# Altium footprint library motionboard.PcbLib: 89 footprints (part 4 of 6)
Each footprint in its own frame and in the unit in brackets; x right, y up, seen from the top. Pads: shape width x height; smd on the part's side, far side on the other; paste and mask are expansions set on the pad; w line width, h text height; cw(c..) or ccw(c..) is an arc to the next point about the centre after c.
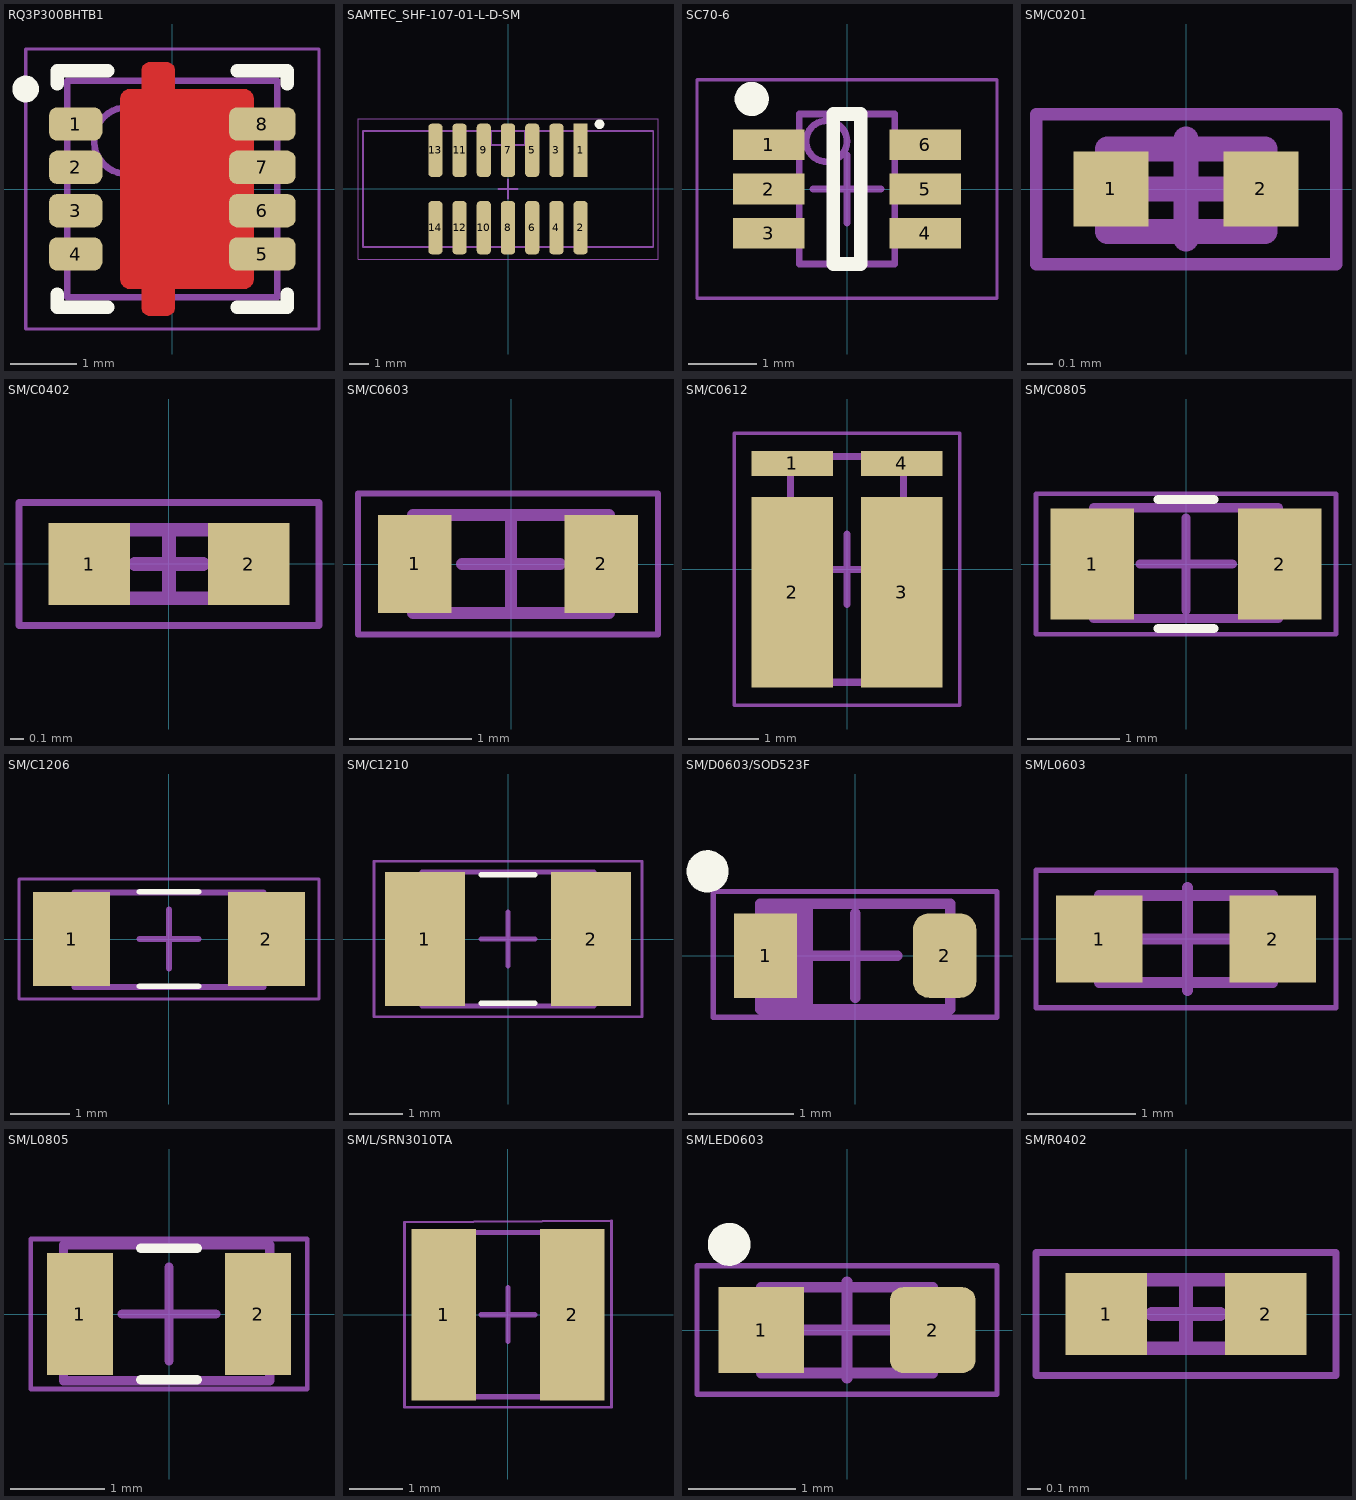
[diagram p3: the footprints below, top view; thin cyan lines are the x and y axes]

## RQ3P300BHTB1 [mm] "8-Leads, Body 3.15x3.05mm, Pitch 0.65mm, Thermal Pad 3.00x2.00mm, Manufacturer Guidelines"
height 0.85
pads (8):
  rrect50% 0.8x0.5 smd: 1(-1.45,0.975) 2(-1.45,0.325) 3(-1.45,-0.325) 4(-1.45,-0.975)
  rrect50% 1x0.5 smd: 5(1.35,-0.975) 6(1.35,-0.325) 7(1.35,0.325) 8(1.35,0.975)
Top Layer:
  region: -0.78,-1.35 -0.78,-1.365 -0.774,-1.394 -0.763,-1.421 -0.747,-1.446 -0.726,-1.467 -0.701,-1.483 -0.674,-1.494 -0.645,-1.5 -0.63,-1.5 -0.46,-1.5 -0.46,-1.775 -0.46,-1.8 -0.441,-1.846 -0.406,-1.881 -0.36,-1.9 -0.335,-1.9 -0.085,-1.9 -0.06,-1.9 -0.014,-1.881 0.021,-1.846 0.04,-1.8 0.04,-1.775 0.04,-1.5 1.07,-1.5 1.085,-1.5 1.114,-1.494 1.141,-1.483 1.166,-1.467 1.187,-1.446 1.203,-1.421 1.214,-1.394 1.22,-1.365 1.22,-1.35 1.22,1.35 1.22,1.365 1.214,1.394 1.203,1.421 1.187,1.446 1.166,1.467 1.141,1.483 1.114,1.494 1.085,1.5 1.07,1.5 0.04,1.5 0.04,1.775 0.04,1.8 0.021,1.846 -0.014,1.881 -0.06,1.9 -0.085,1.9 -0.335,1.9 -0.36,1.9 -0.406,1.881 -0.441,1.846 -0.46,1.8 -0.46,1.775 -0.46,1.5 -0.63,1.5 -0.645,1.5 -0.674,1.494 -0.701,1.483 -0.726,1.467 -0.747,1.446 -0.763,1.421 -0.774,1.394 -0.78,1.365 -0.78,1.35
Top Overlay:
  circle w0.2: c-2.2,1.5 r0.1
  lines w0.2: -1.725,-1.575 -1.725,-1.775 -0.97,-1.775 ; -1.725,1.575 -1.725,1.775 -0.97,1.775 ; 0.97,-1.775 1.725,-1.775 1.725,-1.575 ; 0.97,1.775 1.725,1.775 1.725,1.575
Top Assembly:
  circle w0.1: c-0.675,0.725 r0.5
  lines w0.1: -1.575,-1.625 1.575,-1.625 1.575,1.625 -1.575,1.625 -1.575,-1.625
Top Courtyard:
  lines w0.05: -2.2,-2.1 2.2,-2.1 2.2,2.1 -2.2,2.1 -2.2,-2.1
  lines w0.1: -0.5,0 0.5,0 ; 0,-0.5 0,0.5
Top Designator:
  text ".Designator" at -2.792,-0.272 h1.2
3D body "RQ3P300BHTB1.STEP": height 0.95, standoff 0, extent -1.699,-1.709 1.701,1.711

## SAMTEC_SHF-107-01-L-D-SM [mm]
pads (14):
  rect 0.74x2.795 smd: 1(3.81,2.032)
  rrect50% 0.74x2.795 smd: 2(3.81,-2.032) 3(2.54,2.032) 4(2.54,-2.032) 5(1.27,2.032) 6(1.27,-2.032) 7(0,2.032) 8(0,-2.032) 9(-1.27,2.032) 10(-1.27,-2.032) 11(-2.54,2.032) 12(-2.54,-2.032) 13(-3.81,2.032) 14(-3.81,-2.032)
Top Overlay:
  circle w0.3: c4.8,3.4 r0.1
Top Assembly:
  lines w0.1: -0.9,3.05 -0.9,2.302 0.9,2.302 0.9,3.05 ; -7.604,-3.048 7.62,-3.048 7.62,3.05 -7.604,3.05 -7.604,-3.048
Top Courtyard:
  lines w0.05: -7.87,-3.68 7.87,-3.68 7.87,3.68 -7.87,3.68 -7.87,-3.68
  lines w0.1: -0.5,0 0.5,0 ; 0,-0.5 0,0.5
Top Designator:
  text ".Designator" at -2.705,-0.272 h1.2
3D body "SHF-107-01-L-D-SM.stp": height 5.33, standoff -0.13, extent -7.62,-3.048 7.62,3.048

## SC70-6 [mm] "SOT363, 6-Leads, Body 2x1.3mm, Pitch 0.65mm, Lead Span 2.1mm, IPC Low Density"
height 1.1
pads (6):
  rect 1.05x0.45 smd: 1(-1.15,0.65) 2(-1.15,0) 3(-1.15,-0.65) 4(1.15,-0.65) 5(1.15,0) 6(1.15,0.65)
Top Overlay:
  circle w0.3: c-1.397,1.321 r0.1
  lines w0.2: -0.2,-1.1 0.2,-1.1 0.2,1.1 -0.2,1.1 -0.2,-1.1
Top Assembly:
  circle w0.1: c-0.3,0.7 r0.3
  lines w0.1: -0.7,-1.1 -0.7,1.1 0.7,1.1 0.7,-1.1 -0.7,-1.1
Top Courtyard:
  lines w0.05: -2.2,-1.6 -2.2,1.6 2.2,1.6 2.2,-1.6 -2.2,-1.6
  lines w0.1: -0.5,0 0,0 ; 0,-0.5 0,0 ; 0,0.5 0,0 ; 0.5,0 0,0
Top Designator:
  text ".Designator" at -2.705,-0.272 h1.2
3D body "SC-70-6.STEP": height 1.1, standoff -0.01, extent -1.15,-1.132 1.1,1.118

## SM/C0201 [mm]
pads (2):
  rect 0.3x0.3 smd: 1(-0.3,0) 2(0.3,0)
Top Assembly:
  lines w0.1: -0.314,-0.171 -0.314,0.159 0.316,0.159 0.316,-0.171 -0.314,-0.171
Top Courtyard:
  lines w0.05: -0.6,-0.3 -0.6,0.3 0.6,0.3 0.6,-0.3 -0.6,-0.3
  lines w0.1: -0.2,0 0,0 ; 0,-0.2 0,0 ; 0,0.2 0,0 ; 0.2,0 0,0
Top Designator:
  text ".Designator" at -2.705,-0.272 h1.2
3D body "c0201c104k9pactu.stp": height 0.33, standoff 0, extent -0.314,-0.171 0.316,0.159

## SM/C0402 [mm] "Chip Resistor, 2-Leads, Body 1.00x0.50mm, IPC Medium Density"
height 0.6
pads (2):
  rect 0.6x0.6 smd: 1(-0.584,0) 2(0.584,0)
Top Assembly:
  lines w0.1: -0.5,-0.25 -0.5,0.25 0.5,0.25 0.5,-0.25 -0.5,-0.25
Top Courtyard:
  lines w0.05: -1.1,-0.45 1.1,-0.45 1.1,0.45 -1.1,0.45 -1.1,-0.45
  lines w0.1: -0.25,0 0.25,0 ; 0,-0.25 0,0.25
Top Designator:
  text ".Designator" at -2.705,-0.272 h1.2
3D body "C0402.STEP": height 0.5, standoff 0, extent -0.5,-0.25 0.5,0.25

## SM/C0603 [mm] "Chip Capacitor, Body 1.6x0.8mm, IPC Low Density"
height 0.6
pads (2):
  rect 0.6x0.8 smd: 1(-0.787,0) 2(0.737,0)
Top Assembly:
  lines w0.1: -0.8,-0.4 0.8,-0.4 0.8,0.4 -0.8,0.4 -0.8,-0.4
Top Courtyard:
  lines w0.05: -1.25,-0.575 1.2,-0.575 1.2,0.575 -1.25,0.575 -1.25,-0.575
  lines w0.1: -0.4,0 0.4,0 ; 0,-0.4 0,0.4
Top Designator:
  text ".Designator" at -2.73,-0.272 h1.2
3D body "SM-C603.STEP": height 0.6, standoff 0, extent -0.8,-0.4 0.8,0.4

## SM/C0612 [mm] "Chip Resistor, Body 1.6x3.2mm, IPC Low Density"
height 0.71
pads (4):
  rect 1.15x0.35 smd: 1(-0.775,1.5) 4(0.775,1.5)
  rect 1.15x2.7 smd: 2(-0.775,-0.325) 3(0.775,-0.325)
Top Assembly:
  lines w0.1: -0.8,-1.6 0.8,-1.6 0.8,1.6 -0.8,1.6 -0.8,-1.6
Top Courtyard:
  lines w0.05: -1.6,-1.925 -1.6,1.925 1.6,1.925 1.6,-1.925 -1.6,-1.925
  lines w0.1: -0.5,0 0.5,0 ; 0,-0.5 0,0.5
Top Designator:
  text ".Designator" at -2.705,-0.272 h1.2
3D body "KRL3216T4A-M-R005-F-T1.STEP": height 0.7, standoff 0, extent -0.8,-1.6 0.8,1.6

## SM/C0805 [mm] "Chip Resistor, Body 2.0x1.3mm, IPC Low Density"
height 0.65
pads (2):
  rect 0.9x1.2 smd: 1(-1.016,0) 2(1.016,0)
Top Overlay:
  lines w0.1: -0.3,-0.7 0.3,-0.7 ; -0.3,0.7 0.3,0.7
Top Assembly:
  lines w0.1: -1,-0.59 -1,0.61 1,0.61 1,-0.59 -1,-0.59
Top Courtyard:
  lines w0.05: -1.626,-0.762 1.626,-0.762 1.626,0.762 -1.626,0.762 -1.626,-0.762
  lines w0.1: -0.5,0 0.5,0 ; 0,-0.5 0,0.5
Top Designator:
  text ".Designator" at -2.705,-0.272 h1.2
3D body "User Library-cap_0805-1.STEP": height 1.2, standoff 0, extent -1,-0.59 1,0.61

## SM/C1206 [mm] "Chip Resistor, Body 3.2x1.6mm, IPC Low Density"
height 0.71
pads (2):
  rect 1.3x1.6 smd: 1(-1.651,0) 2(1.651,0)
Top Overlay:
  lines w0.1: -0.5,-0.8 0.5,-0.8 ; -0.5,0.8 0.5,0.8
Top Assembly:
  lines w0.1: -1.6,-0.813 1.6,-0.813 1.6,0.787 -1.6,0.787 -1.6,-0.813
Top Courtyard:
  lines w0.05: -2.54,-1.016 -2.54,1.016 2.54,1.016 2.54,-1.016 -2.54,-1.016
  lines w0.1: -0.5,0 0.5,0 ; 0,-0.5 0,0.5
Top Designator:
  text ".Designator" at -2.705,-0.272 h1.2
3D body "CAP 1206.STEP": height 1.58, standoff -0.02, extent -1.6,-0.813 1.6,0.787

## SM/C1210 [mm] "Chip Resistor, Body 3.2x1.6mm, IPC Low Density"
height 0.71
pads (2):
  rect 1.5x2.5 smd: 1(-1.55,0) 2(1.55,0)
Top Overlay:
  lines w0.1: -0.5,-1.2 0.5,-1.2 ; -0.5,1.2 0.5,1.2
Top Assembly:
  lines w0.1: -1.6,-1.25 1.6,-1.25 1.6,1.25 -1.6,1.25 -1.6,-1.25
Top Courtyard:
  lines w0.05: -2.5,-1.45 2.5,-1.45 2.5,1.45 -2.5,1.45 -2.5,-1.45
  lines w0.1: -0.5,0 0.5,0 ; 0,-0.5 0,0.5
Top Designator:
  text ".Designator" at -2.705,-0.272 h1.2
3D body "1210.STEP": height 2.5, standoff 0, extent -1.6,-1.25 1.6,1.25

## SM/D0603/SOD523F [mm] "Chip Diode, 2-Leads, Body 1.70x0.80mm, IPC Medium Density"
height 0.6
pads (2):
  rect 0.6x0.8 smd: 1(-0.85,0)
  rrect50% 0.6x0.8 smd: 2(0.85,0)
Top Overlay:
  circle w0.2: c-1.4,0.8 r0.1
Top Assembly:
  rectangle: -0.901,-0.5 -0.4,0.492
  lines w0.1: -0.901,-0.508 0.901,-0.508 0.901,0.492 -0.901,0.492 -0.901,-0.508
Top Courtyard:
  lines w0.05: -1.346,-0.584 1.346,-0.584 1.346,0.61 -1.346,0.61 -1.346,-0.584
  lines w0.1: -0.4,0 0.4,0 ; 0,-0.4 0,0.4
Top Designator:
  text ".Designator" at -2.819,-0.076 h1.2
3D body "0603-SOD-523F.STEP": height 0.85, standoff -0.01, extent -0.901,-0.508 0.901,0.492

## SM/L0603 [mm] "Chip Capacitor, Body 1.6x0.8mm, IPC Low Density"
height 0.6
pads (2):
  rect 0.8x0.8 smd: 1(-0.8,0) 2(0.8,0)
Top Assembly:
  lines w0.1: -0.8,-0.4 -0.8,0.4 0.8,0.4 0.8,-0.4 -0.8,-0.4
Top Courtyard:
  lines w0.05: -1.384,-0.635 -1.384,0.635 1.384,0.635 1.384,-0.635 -1.384,-0.635
  lines w0.1: -0.462,0 0.488,0 ; 0.013,-0.475 0.013,0.475
Top Designator:
  text ".Designator" at -2.705,-0.272 h1.2
3D body "SM-L0603.STEP": height 0.45, standoff 0, extent -0.8,-0.4 0.8,0.4

## SM/L0805 [mm] "Chip Resistor, Body 2.0x1.3mm, IPC Low Density"
height 0.65
pads (2):
  rect 0.7x1.3 smd: 1(-0.95,0) 2(0.95,0)
Top Overlay:
  lines w0.1: -0.3,-0.7 0.3,-0.7 ; -0.3,0.7 0.3,0.7
Top Assembly:
  lines w0.1: -1.125,-0.713 -1.125,0.737 1.075,0.737 1.075,-0.713 -1.125,-0.713
Top Courtyard:
  lines w0.05: -1.473,-0.8 1.473,-0.8 1.473,0.8 -1.473,0.8 -1.473,-0.8
  lines w0.1: -0.5,0 0.5,0 ; 0,-0.5 0,0.5
Top Designator:
  text ".Designator" at -2.705,-0.272 h1.2
3D body "l0805.STEP": height 0.87, standoff -0.01, extent -1.125,-0.713 1.075,0.737

## SM/L/SRN3010TA [mm]
pads (2):
  rect 1.2x3.2 smd: 1(-1.2,0) 2(1.2,0)
Top Assembly:
  lines w0.1: -1.475,-1.535 1.475,-1.535 1.475,1.535 -1.475,1.535 -1.475,-1.535
Top Courtyard:
  lines w0.05: -1.93,-1.727 -1.93,1.727 1.93,1.753 1.93,-1.727 -1.93,-1.727
  lines w0.1: -0.5,0 0.5,0 ; 0,-0.5 0,0.5
Top Designator:
  text ".Designator" at -2.705,-0.259 h1.2
3D body "SRN3010TA.STP": height 0.9, standoff -0.02, extent -1.475,-1.535 1.475,1.535

## SM/LED0603 [mm] "Chip Capacitor, Body 1.6x0.8mm, IPC Low Density"
height 0.6
pads (2):
  rect 0.8x0.8 smd: 1(-0.8,0)
  rrect30% 0.8x0.8 smd: 2(0.8,0)
Top Overlay:
  circle w0.2: c-1.1,0.8 r0.1
Top Assembly:
  lines w0.1: -0.8,-0.4 0.8,-0.4 0.8,0.4 -0.8,0.4 -0.8,-0.4
Top Courtyard:
  lines w0.05: -1.4,-0.6 -1.4,0.6 1.4,0.6 1.4,-0.6 -1.4,-0.6
  lines w0.1: -0.45,0 0.45,0 ; 0,-0.45 0,0.45
Top Designator:
  text ".Designator" at -2.705,-0.084 h1.2
3D body "XZxx53-1.STEP": height 0.73, standoff -0.02, extent -0.801,-0.401 0.81,0.401

## SM/R0402 [mm] "Chip Resistor, 2-Leads, Body 1.00x0.50mm, IPC Medium Density"
height 0.6
pads (2):
  rect 0.6x0.6 smd: 1(-0.584,0) 2(0.584,0)
Top Assembly:
  lines w0.1: -0.5,-0.25 0.5,-0.25 0.5,0.25 -0.5,0.25 -0.5,-0.25
Top Courtyard:
  lines w0.05: -1.1,-0.45 1.1,-0.45 1.1,0.45 -1.1,0.45 -1.1,-0.45
  lines w0.1: -0.25,0 0.25,0 ; 0,-0.25 0,0.25
Top Designator:
  text ".Designator" at -2.705,-0.272 h1.2
3D body "R0402.STEP": height 0.3, standoff 0, extent -0.5,-0.25 0.5,0.25